# Altium footprint library ic.PcbLib: 68 footprints (part 5 of 5)
Each footprint in its own frame and in the unit in brackets; x right, y up, seen from the top. Pads: shape width x height; smd on the part's side, far side on the other; paste and mask are expansions set on the pad; w line width, h text height; cw(c..) or ccw(c..) is an arc to the next point about the centre after c.
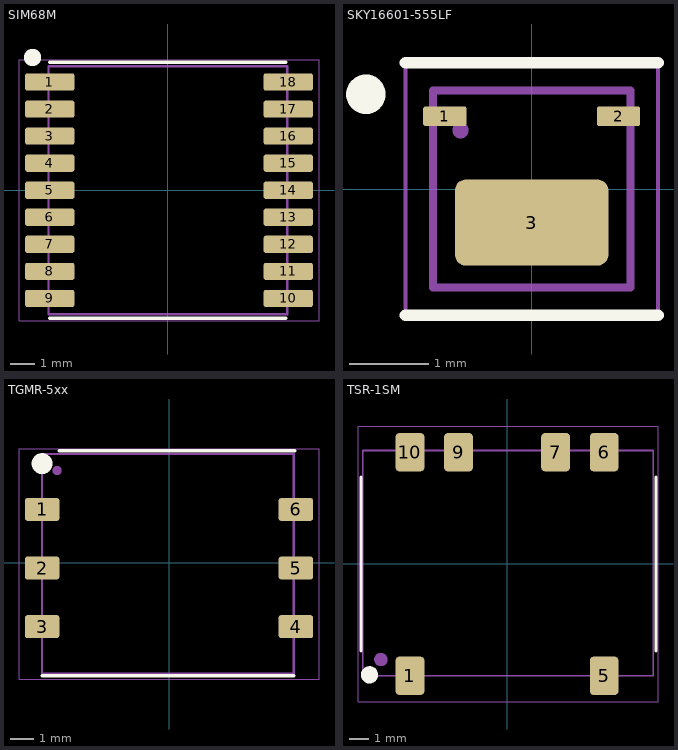
[diagram p4: the footprints below, top view; thin cyan lines are the x and y axes]

## SIM68M [mm]
pads (18):
  rrect25% 2x0.7 smd: 1(-4.8,4.4) 2(-4.8,3.3) 3(-4.8,2.2) 4(-4.8,1.1) 5(-4.8,0) 6(-4.8,-1.1) 7(-4.8,-2.2) 8(-4.8,-3.3) 9(-4.8,-4.4) 10(4.9,-4.4) 11(4.9,-3.3) 12(4.9,-2.2) 13(4.9,-1.1) 14(4.9,0) 15(4.9,1.1) 16(4.9,2.2) 17(4.9,3.3) 18(4.9,4.4)
Top Overlay:
  circle w0.5: c-5.5,5.4 r0.1
  lines w0.15: -4.8,-5.2 4.8,-5.2 ; -4.8,5.2 4.8,5.2
Top Assy:
  circle w0.2: c-4.15,4.35 r0.1
  lines w0.1: -4.85,-5.05 -4.85,5.05 4.85,5.05 4.85,-5.05 -4.85,-5.05
  text ".Designator" at 0,0 h1
Top Cortyard:
  lines w0.05: -6.05,-5.3 -6.05,5.3 6.15,5.3 6.15,-5.3 -6.05,-5.3
3D body "User Library-SIM68M.step": height 2.56, standoff -0.01, extent -4.86,-5.05 4.86,5.05

## SKY16601-555LF [mm]
height 2.1
pads (3):
  rrect25% 0.55x0.25 smd: 1(-1.1,0.922) 2(1.1,0.922)
  rrect25% 1.942x1.092 smd: 3(0,-0.425)
Top Overlay:
  circle w0.3: c-2.1,1.2 r0.1
  lines w0.15: -1.6,-1.6 1.6,-1.6 ; -1.6,1.6 1.6,1.6
Top Assy:
  lines w0.1: -1.25,-1.25 -1.25,1.25 1.25,1.25 1.25,-1.25 -1.25,-1.25
  lines w0.2: -0.901,0.737 ccw(c-1,0.75) -0.9,0.75
  text ".Designator" at -0.75,-0.5 h0.75
Top Cortyard:
  lines w0.05: -1.6,-1.6 1.6,-1.6 1.6,1.6 -1.6,1.6 -1.6,-1.6
3D body: height 0.75, standoff 0, extent -1.25,-1.25 1.25,1.25

## TGMR-5xx [mm]
height 0.165
pads (7):
  rrect25% 1.5x1 smd: 1(-5.5,2.315) 2(-5.5,-0.225) 3(-5.5,-2.765) 4(5.5,-2.765) 5(5.5,-0.225) 6(5.5,2.315)
  round 0 smd paste-25.4 mask-25.4: 1(-5.4,2.765)
Top Overlay:
  circle w0.5: c-5.5,4.3 r0.2
  lines w0.15: -5.5,-4.9 5.4,-4.9 ; -4.75,4.85 5.45,4.85
Top Assy:
  circle w0.2: c-4.85,4 r0.1
  lines w0.1: -5.5,4.7 -5.5,-4.8 5.4,-4.8 5.4,4.7 ; -5.5,4.715 5.4,4.715
  text ".Designator" at 0,0 h1
Top Cortyard:
  lines w0.05: -6.5,-5.05 -6.5,4.95 6.5,4.95 6.5,-5.05 -6.5,-5.05
3D body: height 3.95, standoff 0, extent -5.5,-4.8 5.4,4.715

## TSR-1SM [mm] "POL switching regulator, SMD package"
height 7.6
pads (6):
  rrect25% 1.5x2 smd: 1(-5.08,-5.85) 5(5.08,-5.85) 6(5.08,5.85) 7(2.54,5.85) 9(-2.54,5.85) 10(-5.08,5.85)
Top Overlay:
  circle w0.5: c-7.2,-5.8 r0.2
  lines w0.15: -7.65,-4.55 -7.65,4.55 ; 7.8,-4.55 7.8,4.55
Top Assy:
  circle w0.5: c-6.6,-5 r0.1
  lines w0.1: -7.55,-5.85 7.65,-5.85 7.65,5.95 -7.55,5.95 -7.55,-5.85
  text ".Designator" at 0,0 h1
Top Cortyard:
  lines w0.05: -7.8,-7.2 -7.8,7.2 7.9,7.2 7.9,-7.2 -7.8,-7.2
3D body "tsr1sm.stp": height 7.56, standoff 0.01, extent -7.58,-5.87 7.66,5.95